# Altium footprint library mylib.PcbLib: 6 footprints
Each footprint in its own frame and in the unit in brackets; x right, y up, seen from the top. Pads: shape width x height; smd on the part's side, far side on the other; paste and mask are expansions set on the pad; w line width, h text height; cw(c..) or ccw(c..) is an arc to the next point about the centre after c.
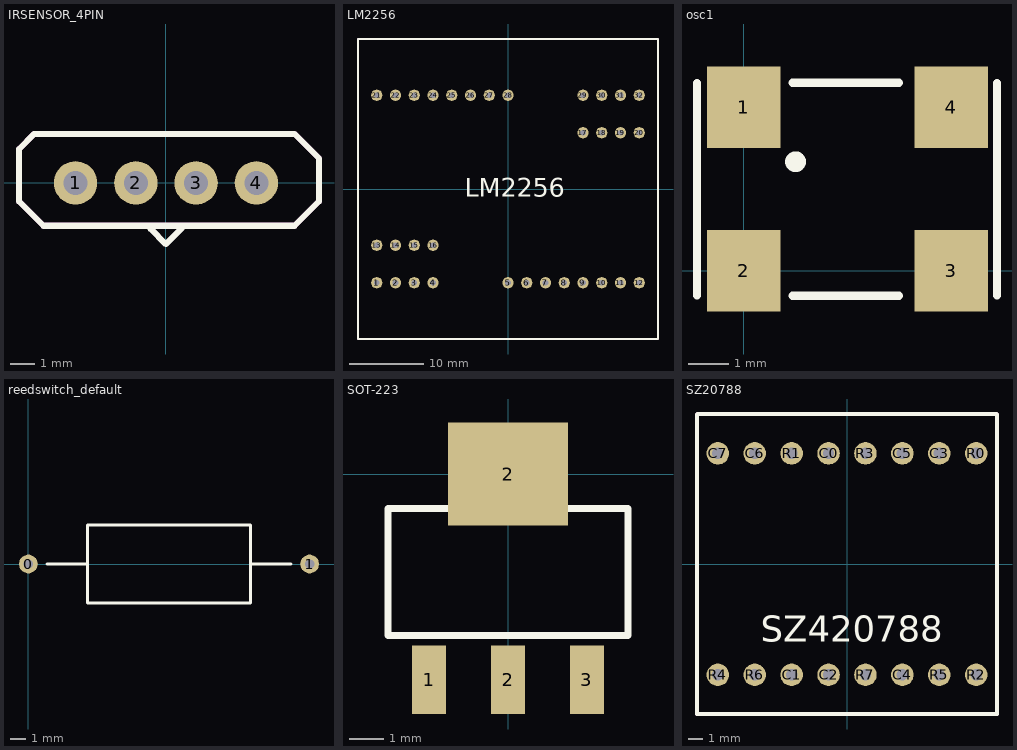
[diagram p0: the footprints below, top view; thin cyan lines are the x and y axes]

## IRSENSOR_4PIN [mm]
pads (4):
  round 1.8 hole 1: 1(-3.75,0) 2(-1.25,0) 3(1.25,0) 4(3.75,0)
Top Overlay:
  lines w0.254: -0.635,-1.905 0,-2.54 0.635,-1.905
Top Overlay keep-out:
  lines w0.254: -6.096,0.635 -6.096,1.397 -5.461,2.032 5.334,2.032 6.35,1.016 6.35,-0.762 5.334,-1.778 -5.08,-1.778 -6.096,-0.762 -6.096,0.762

## LM2256 [mil]
pads (32):
  round 60 hole 30: 1(-700,-500) 2(-600,-500) 3(-500,-500) 4(-400,-500) 5(0,-500) 6(100,-500) 7(200,-500) 8(300,-500) 9(400,-500) 10(500,-500) 11(600,-500) 12(700,-500) 13(-700,-300) 14(-600,-300) 15(-500,-300) 16(-400,-300) 17(400,300) 18(500,300) 19(600,300) 20(700,300) 21(-700,500) 22(-600,500) 23(-500,500) 24(-400,500) 25(-300,500) 26(-200,500) 27(-100,500) 28(0,500) 29(400,500) 30(500,500) 31(600,500) 32(700,500)
Top Overlay:
  text "LM2256" at -231.3,-40.35 h98.43
Top Overlay keep-out:
  lines w10: -800,-800 -800,800 800,800 800,-800 -800,-800

## osc1 [mm]
pads (4):
  rect 1.8x2 smd: 1(0,4) 2(0,0) 3(5.08,0) 4(5.08,4)
Top Overlay:
  circle w0.254: c1.27,2.667 r0.127
  lines w0.2: -1.141,-0.61 -1.141,4.59 ; 1.2,-0.61 3.8,-0.61 ; 1.2,4.6 3.8,4.6 ; 6.2,-0.61 6.2,4.59

## reedswitch_default [mm]
pads (2):
  round 1.2 hole 0.6: 0(0,0) 1(18,0)
Top Overlay:
  lines w0.2: 1.2,0 3.775,0 ; 14.225,0 16.8,0 ; 3.775,0 3.775,2.5 14.225,2.5 14.225,-2.5 3.775,-2.5 3.775,0

## SOT-223 [mm]
pads (4):
  rect 1x2 smd: 1(-2.3,-5.994) 2(0,-5.994) 3(2.3,-5.994)
  rect 3.5x3 smd: 2(0,0)
Top Overlay:
  lines w0.203: -3.5,-4.7 -3.5,-1 3.5,-1 3.5,-4.7 -3.5,-4.7

## SZ20788 [mil]
pads (16):
  round 60 hole 30: C0(-49.21,295.28) C1(-147.64,-295.28) C2(-49.21,-295.28) C3(246.06,295.28) C4(147.64,-295.28) C5(147.64,295.28) C6(-246.06,295.28) C7(-344.49,295.28) R0(344.49,295.28) R1(-147.64,295.28) R2(344.49,-295.28) R3(49.21,295.28) R4(-344.49,-295.28) R5(246.06,-295.28) R6(-246.06,-295.28) R7(49.21,-295.28)
Top Overlay:
  text "SZ420788" at -230,-230 h118.11
Top Overlay keep-out:
  lines w10: -400,399.61 -400,-399.61 399.21,-399.61 ; -399.61,400 399.61,400 ; 400,-399.61 400,399.61